# Altium footprint library MyPcbLib.PcbLib: 233 footprints (part 5 of 15)
Each footprint in its own frame and in the unit in brackets; x right, y up, seen from the top. Pads: shape width x height; smd on the part's side, far side on the other; paste and mask are expansions set on the pad; w line width, h text height; cw(c..) or ccw(c..) is an arc to the next point about the centre after c.
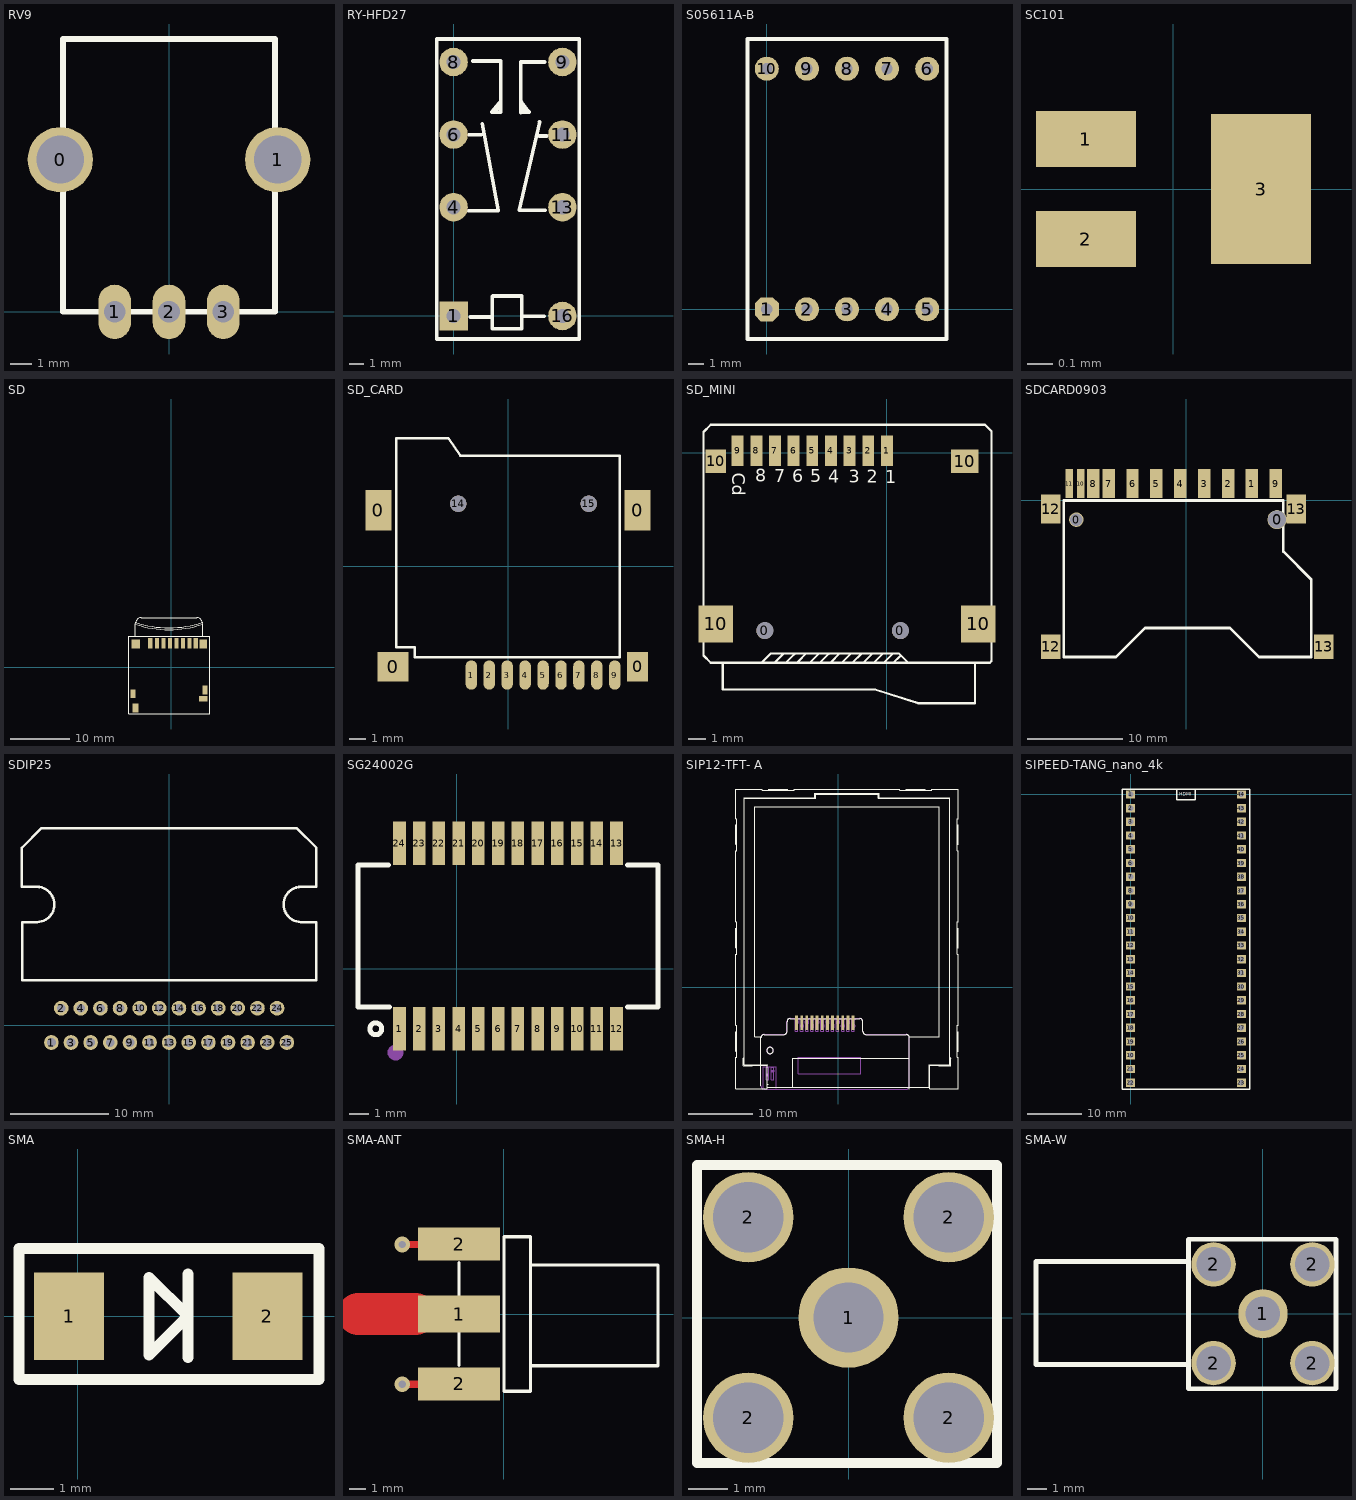
[diagram p4: the footprints below, top view; thin cyan lines are the x and y axes]

## RV9 [mm]
pads (5):
  round 3 hole 2.2: 0(-5,7) 1(5,7)
  oval 1.5x2.5 hole 1: 1(-2.5,0) 2(0,0) 3(2.5,0)
Top Overlay:
  lines w0.254: -4.876,0 -4.876,12.55 4.876,12.55 4.876,0 -4.876,0
3D body "User Library-RV09ACF-40_RK09K1130A5R.step": height 20, standoff -3.8, extent -4.876,0 4.876,12.55

## RY-HFD27 [mm]
pads (8):
  rect 2x2 hole 1: 1(0,0)
  round 2 hole 1: 4(0,7.62) 6(0,12.7) 8(0,17.78) 9(7.62,17.78) 11(7.62,12.7) 13(7.62,7.62) 16(7.62,0)
Top Overlay:
  lines w0.254: 1.022,7.375 3.128,7.375 2.004,13.46 ; 1.058,12.693 1.932,12.693 ; 1.183,-0.066 2.629,-0.066 ; 1.344,17.85 3.307,17.85 3.306,14.263 2.664,14.263 3.217,14.923 3.021,14.406 ; 4.734,15.013 5.287,14.281 5.269,14.263 4.698,14.245 4.699,17.779 6.394,17.779 ; 4.805,14.781 4.966,14.352 ; 4.877,-0.013 6.34,-0.013 ; 6.001,12.604 6.519,12.604 ; 6.019,13.585 4.609,7.411 6.429,7.411 ; -1.19,-1.61 8.81,-1.61 8.81,19.39 -1.19,19.39 -1.19,-1.61 ; 2.7,-0.887 2.7,1.076 2.7,1.361 2.736,1.397 4.77,1.397 4.77,-0.869 4.752,-0.887 2.7,-0.887
3D body "User Library-OMRON G5V-2.STEP": height 10.92, standoff -4, extent -1.143,-1.27 8.857,19.13

## S05611A-B [mil]
pads (10):
  oct 60x60 hole 28: 1(0,0)
  round 60 hole 28: 2(100,0) 3(200,0) 4(300,0) 5(400,0) 6(400,600) 7(300,600) 8(200,600) 9(100,600) 10(0,600)
Top Overlay:
  lines w10: -48.03,-74.02 448.03,-74.02 448.03,674.02 -48.03,674.02 -48.03,-74.02
  text ".56'" at 100,280 h60
3D body "S5611A-B.STEP": height 316.25, standoff -156.19, extent -50,-75 450,675

## SC101 [mm]
height 0.5
pads (3):
  rect 0.4x0.225 smd: 1(-0.35,0.2) 2(-0.35,-0.2)
  rect 0.4x0.6 smd: 3(0.35,0)
3D body "SC101.STEP": height 0.5, standoff 0, extent -0.519,-0.32 0.521,0.32

## SD [mm]
pads (14):
  rect 0.7x1.75 smd: P$1(-3.509,4.048) P$2(-2.409,4.048) P$3(-1.309,4.048) P$4(-0.209,4.048) P$5(0.891,4.048) P$6(1.991,4.048) P$7(3.091,4.048) P$8(4.151,4.048)
  rect 1.5x1.5 smd: P$9(-5.959,3.948)
  rect 1.3x1.5 smd: P$10(5.391,3.948)
  rect 0.8x1.5 smd: P$11(5.691,-3.802)
  rect 1.45x1 smd: P$12(5.391,-5.302)
  rect 0.8x1.4 smd: P$13(-6.409,-4.452)
  rect 1x1.55 smd: P$14(-6.009,-6.852)
Top Overlay:
  lines w0.127: -6.009,5.207 -6.009,7.248 -6.009,7.348 cw(c-5.009,7.348) -5.009,8.348 4.291,8.348 cw(c4.291,7.348) 5.291,7.348 5.291,7.248 ; -6.009,7.248 ccw(c-0.359,24.348) 5.291,7.248 ; -6.009,7.548 ccw(c-0.359,24.648) 5.291,7.548 ; 5.291,5.207 5.291,7.248 ; -7.112,-7.874 -7.112,5.207 6.477,5.207 6.477,-7.874 -7.112,-7.874
3D body "MicroSD.STEP": height 1.85, standoff -0.05, extent -7.515,-7.86 6.735,7.34

## SD_CARD [mm]
pads (15):
  rect 1.6x2.5 smd: 0(-7.953,3.429) 0(7.947,3.429)
  rect 1.9x1.8 smd: 0(-7.053,-6.171)
  rect 1.3x1.8 smd: 0(7.947,-6.171)
  oval 0.7x1.8 smd: 1(-2.253,-6.671) 2(-1.153,-6.671) 3(-0.053,-6.671) 4(1.047,-6.671) 5(2.147,-6.671) 6(3.247,-6.671) 7(4.347,-6.671) 8(5.447,-6.671) 9(6.547,-6.671)
  round 1 hole 1: 14(-3.053,3.829) 15(4.947,3.829)
Top Overlay:
  lines w0.152: -6.858,-4.953 -5.715,-4.953 -5.715,-5.588 -5.08,-5.588 6.401,-5.588 6.858,-5.588 6.858,6.782 -2.921,6.782 -3.658,7.849 -6.858,7.849 -6.858,-4.572 -6.858,-4.953
3D body "SDcard.STEP": height 2.05, standoff -0.4, extent -8,-7.4 8,7.85

## SD_MINI [mm]
pads (15):
  round 1 hole 1 unplated: 0(-7.2,-10.5) 0(0.8,-10.5)
  rect 0.7x1.8 smd: 1(0,0.127) 2(-1.1,0.127) 3(-2.2,0.127) 4(-3.3,0.127) 5(-4.4,0.127) 6(-5.5,0.127) 7(-6.6,0.127) 8(-7.7,0.127) 9(-8.8,0.127)
  rect 2.032x2.2 smd: 10(-10.1,-10.1) 10(5.4,-10.1)
  rect 1.2x1.4 smd: 10(-10.1,-0.5)
  rect 1.6x1.4 smd: 10(4.6,-0.5)
Top Overlay:
  lines w0.127: -9.677,-12.395 -9.677,-13.97 -0.686,-13.97 ; -6.629,-12.395 -6.096,-11.862 -6.096,-11.836 ; -5.969,-12.395 -5.461,-11.887 -5.461,-11.836 ; -5.232,-12.395 -5.232,-12.319 -4.75,-11.836 ; -4.547,-12.395 -3.988,-11.836 -3.962,-11.836 ; -3.962,-12.395 -3.429,-11.862 -3.429,-11.836 ; -3.327,-12.395 -2.769,-11.836 -2.667,-11.836 ; -2.667,-12.395 -2.108,-11.836 -2.083,-11.836 ; -2.032,-12.395 -1.499,-11.862 -1.499,-11.836 ; -1.397,-12.395 -0.838,-11.836 -0.711,-11.836 ; -0.762,-12.395 -0.203,-11.836 -0.178,-11.836 ; -0.711,-13.97 1.854,-14.783 5.207,-14.783 5.207,-12.421 ; -0.178,-12.395 0.381,-11.836 ; 0.381,-12.395 0.787,-11.989 0.864,-11.989 ; -10.389,-12.395 -7.391,-12.395 -6.833,-11.836 0.711,-11.836 1.27,-12.395 6.071,-12.395 ; -10.389,-12.395 6.071,-12.395 ; -10.389,-12.395 -10.82,-11.963 -10.82,1.219 -10.389,1.651 5.791,1.651 6.172,1.27 6.172,-12.294 6.071,-12.395
  text "1" at -0.102,-1.803 h0.76
  text "2" at -1.194,-1.778 h0.76
  text "3" at -2.261,-1.778 h0.76
  text "4" at -3.454,-1.778 h0.76
  text "5" at -4.521,-1.753 h0.76
  text "6" at -5.588,-1.753 h0.76
  text "7" at -6.655,-1.753 h0.76
  text "8" at -7.772,-1.727 h0.76
  text "Cd" at -9.119,-1.168 h0.76
3D body "sdcard.STEP": height 1.8, standoff -0.7, extent -10.372,-14.725 5.901,0.469

## SDCARD0903 [mm] "SD卡插座0903"
pads (17):
  round 1.524 hole 1.321: 0(-11.5,-2)
  round 2 hole 1.9: 0(9.5,-2)
  rect 1.3x3 smd: 1(6.875,1.778) 2(4.375,1.778) 3(1.875,1.778) 4(-0.625,1.778) 5(-3.125,1.778) 6(-5.625,1.778) 7(-8.125,1.778) 8(-9.75,1.778) 9(9.375,1.778)
  rect 0.762x3 smd: 10(-11.05,1.778) 11(-12.25,1.778)
  rect 2.032x2.54 smd: 12(-14.2,-15.3) 13(14.4,-15.3)
  rect 2.032x3.048 smd: 12(-14.2,-0.9) 13(11.5,-0.9)
Top Overlay:
  lines w0.279: -12.827,-16.383 -12.827,0 10.16,0 10.16,-5.334 13.081,-8.255 13.081,-16.383 7.62,-16.383 4.572,-13.335 0,-13.335 -4.318,-13.335 -7.366,-16.383 -12.827,-16.383
3D body "SD Kart.step": height 3, standoff -1, extent -14.224,-28.564 14.376,1.436

## SDIP25 [mm]
pads (25):
  round 1.5 hole 0.9: 1(-12,-1.75) 2(-11,1.75) 3(-10,-1.75) 4(-9,1.75) 5(-8,-1.75) 6(-7,1.75) 7(-6,-1.75) 8(-5,1.75) 9(-4,-1.75) 10(-3,1.75) 11(-2,-1.75) 12(-1,1.75) 13(0,-1.75) 14(1,1.75) 15(2,-1.75) 16(3,1.75) 17(4,-1.75) 18(5,1.75) 19(6,-1.75) 20(7,1.75) 21(8,-1.75) 22(9,1.75) 23(10,-1.75) 24(11,1.75) 25(12,-1.75)
Top Overlay:
  lines w0.254: -14.986,10.505 -14.986,4.6 15,4.6 15,10.53 ; -14.986,10.53 -13.437,10.53 ; -13.538,14.137 -15,14.137 -15,18.1 -13,20.1 13,20.1 15,18.1 15,14.137 ; 13.386,14.137 14.975,14.137 ; 13.437,10.53 14.975,10.53
  lines w0.257: -13.459,14.12 cw(c-13.5,12.321) -13.451,10.521 ; 13.426,14.12 ccw(c13.475,12.321) 13.433,10.521
3D body "HZIP25.step": height 19.2, standoff -2.5, extent -14.063,-1.882 15.138,6.528

## SG24002G [mm]
pads (24):
  rect 0.64x2.2 smd: 1(-2.899,-3.043) 2(-1.899,-3.043) 3(-0.899,-3.043) 4(0.101,-3.043) 5(1.101,-3.043) 6(2.101,-3.043) 7(3.101,-3.043) 8(4.101,-3.043) 9(5.101,-3.043) 10(6.101,-3.043) 11(7.101,-3.043) 12(8.101,-3.043) 13(8.101,6.357) 14(7.101,6.357) 15(6.101,6.357) 16(5.101,6.357) 17(4.101,6.357) 18(3.101,6.357) 19(2.101,6.357) 20(1.101,6.357) 21(0.101,6.357) 22(-0.899,6.357) 23(-1.899,6.357) 24(-2.899,6.357)
Top Overlay:
  circle w0.254: c-4.099,-3.043 r0.3
  lines w0.254: -3.45,5.257 -4.999,5.257 -4.999,-1.943 -3.399,-1.943 ; 8.652,-1.943 10.201,-1.943 10.201,5.257 8.652,5.257
Mechanical 15:
  circle w0.4: c-3.099,-4.243 r0.2

## SIP12-TFT- A [mm]
pads (12):
  rect 0.43x2.3 smd: 1(2.305,-5.523) 2(1.505,-5.523) 3(0.705,-5.523) 4(-0.095,-5.523) 5(-0.895,-5.523) 6(-1.695,-5.523) 7(-2.495,-5.523) 8(-3.295,-5.523) 9(-4.095,-5.523) 10(-4.895,-5.523) 11(-5.695,-5.523) 12(-6.495,-5.523)
Top Overlay:
  circle w0.127: c-10.635,-9.83 r0.5
  lines w0.127: -15.793,-9.916 -15.993,-9.916 ; -15.793,-6.916 -15.993,-6.916 ; -15.793,6.184 -15.993,6.184 ; -15.793,9.184 -15.993,9.184 ; -15.793,22.284 -15.993,22.284 ; -15.793,25.284 -15.993,25.284 ; -14.243,-12.202 -14.243,-12.052 ; -12.036,-15.354 -12.036,-7.854 cw(c-11.536,-7.854) -11.536,-7.354 -8.476,-7.354 ccw(c-8.476,-6.854) -7.976,-6.854 -7.976,-5.354 cw(c-7.476,-5.354) -7.476,-4.854 3.324,-4.854 cw(c3.324,-5.354) 3.824,-5.354 3.824,-6.854 ccw(c4.324,-6.854) 4.324,-7.354 10.574,-7.354 cw(c10.574,-7.854) 11.074,-7.854 11.074,-15.516 ; -12.036,-7.696 -13.009,-7.696 -13.009,28.144 15.723,28.144 15.723,-7.696 11.074,-7.696 ; -11.043,-15.566 14.257,-15.566 ; -10.943,-15.516 14.157,-15.516 14.157,-12.052 17.323,-12.052 17.323,29.468 6.257,29.468 6.257,30.084 -3.543,30.084 -3.543,29.468 -14.609,29.468 -14.609,-12.052 -10.943,-12.052 ; -10.943,-15.066 -11.043,-15.066 -10.893,-15.066 ; -10.84,30.684 -10.84,30.884 ; -8.643,-15.566 -8.643,-15.516 ; -7.84,30.684 -7.84,30.884 ; -7.083,-15.494 -7.083,-11.002 11.057,-11.002 11.057,-15.824 ; 10.555,30.684 10.555,30.884 ; 11.857,-15.566 11.857,-15.516 ; 13.555,30.684 13.555,30.884 ; 14.107,-15.066 14.257,-15.066 14.157,-15.066 ; 17.157,-12.202 17.157,-12.052 ; 17.373,-4.466 17.373,22.214 ; 18.507,-9.916 18.707,-9.916 ; 18.507,-6.916 18.707,-6.916 ; 18.507,6.184 18.707,6.184 ; 18.507,9.184 18.707,9.184 ; 18.507,22.284 18.707,22.284 ; 18.507,25.284 18.707,25.284 ; -15.993,-9.916 -15.993,-6.916 ; -15.993,-9.916 -15.993,-6.916 ; -15.993,6.184 -15.993,9.184 ; -15.993,6.184 -15.993,9.184 ; -15.993,22.284 -15.993,25.284 ; -15.993,22.284 -15.993,25.284 ; -10.84,30.884 -7.84,30.884 ; -10.84,30.884 -7.84,30.884 ; 10.555,30.884 13.555,30.884 ; 10.555,30.884 13.555,30.884 ; 18.707,-9.916 18.707,-6.916 ; 18.707,-9.916 18.707,-6.916 ; 18.707,6.184 18.707,9.184 ; 18.707,6.184 18.707,9.184 ; 18.707,22.284 18.707,25.284 ; 18.707,22.284 18.707,25.284 ; -15.993,-15.816 -11.043,-15.816 -11.043,-12.102 -13.259,-12.102 -13.366,-12.202 -14.759,-12.202 -14.759,-11.062 -14.659,-10.898 -14.659,29.518 -3.643,29.518 -3.643,30.184 6.357,30.184 6.357,29.518 17.373,29.518 17.373,-10.898 17.473,-11.062 17.473,-12.202 15.657,-12.202 15.527,-12.102 14.257,-12.102 14.257,-15.816 18.707,-15.816 18.707,-10.916 18.507,-10.916 18.507,-5.916 18.707,-5.916 18.707,5.184 18.507,5.184 18.507,10.184 18.707,10.184 18.707,21.284 18.507,21.284 18.507,26.284 18.707,26.284 18.707,30.884 14.555,30.884 14.555,30.684 9.555,30.684 9.555,30.884 -6.84,30.884 -6.84,30.684 -11.84,30.684 -11.84,30.884 -15.993,30.884 -15.993,26.284 -15.793,26.284 -15.793,21.284 -15.993,21.284 -15.993,10.184 -15.793,10.184 -15.793,5.184 -15.993,5.184 -15.993,-5.916 -15.793,-5.916 -15.793,-10.916 -15.993,-10.916 -15.993,-15.816
Mechanical 3:
  drawing of 186 lines, arcs and shapes, not listed
  text "K" at -11.202,-14.855 h0.41
  text "A" at -10.395,-14.839 h0.41
3D body "LCD.STEP": height 2.2, standoff 0, extent -15.9,-15.68 18.6,30.92

## SIPEED-TANG_nano_4k [mil]
pads (44):
  rect 65x60 hole 40: 1(0,0) 2(0,-100) 3(0,-200) 4(0,-300) 5(0,-400) 6(0,-500) 7(0,-600) 8(0,-700) 9(0,-800) 10(0,-1900) 10(0,-900) 11(0,-1000) 12(0,-1100) 13(0,-1200) 14(0,-1300) 15(0,-1400) 16(0,-1500) 17(0,-1600) 18(0,-1700) 19(0,-1800) 21(0,-2000) 22(0,-2100) 23(807.09,-2100) 24(807.09,-2000) 25(807.09,-1900) 26(807.09,-1800) 27(807.09,-1700) 28(807.09,-1600) 29(807.09,-1500) 30(807.09,-1400) 31(807.09,-1300) 32(807.09,-1200) 33(807.09,-1100) 34(807.09,-1000) 35(807.09,-900) 36(807.09,-800) 37(807.09,-700) 38(807.09,-600) 39(807.09,-500) 40(807.09,-400) 41(807.09,-300) 42(807.09,-200) 43(807.09,-100) 44(807.09,0)
Top Overlay:
  lines w10: 334.65,39.37 334.65,-39.37 472.44,-39.37 472.44,39.37 ; -59.06,-2145.67 -59.06,39.37 866.14,39.37 866.14,-2145.67 0,-2145.67 -39.37,-2145.67 -59.06,-2145.67
  text "HDMI" at 354.33,-19.68 h39.37

## SMA [mil] "DO-214AC(2010)"
pads (2):
  rect 63x78.74 smd: 1(-8,0) 2(170.56,0)
Top Overlay:
  lines w10: 99,-37 99,38 ; -53,-57 -53,61 217,61 217,-57 -53,-57 ; 64,-35 64,35 99,0 64,-35
3D body "DO-214AC.STEP": height 94.49, standoff 0, extent -7.55,-52.15 173.55,54.15

## SMA-ANT [mil] "142-0701-801/806"
pads (3):
  rect 200x90 smd: 1(-109,0)
  rect 200x80 all layers, no hole: 2(-109,-170) 2(-109,170)
via -247,-171 diameter 38 hole 18
via -247,169 diameter 38 hole 18
Top Layer:
  lines w18: -248,169 -128,169 ; -247,-171 -99,-171
  lines w103: -355,0 -216,0
Top Overlay:
  lines w7.87: -109,-125 -109,125 ; 68,-126 375,-126 375,119 68,119 ; 0,-188 0,188 65,188 65,-188 0,-188
3D body "SMA - 50 Ohm Connectors 142-0701-801.step": height 175.51, standoff -136.3, extent -190.91,-186 370.9,188.8

## SMA-H [mil]
pads (5):
  round 100 hole 70: 1(0,0)
  round 90 hole 70: 2(-100,-100) 2(-100,100) 2(100,-100) 2(100,100)
Top Overlay:
  lines w10: -151,-145 -151,152 148,152 148,-145 -151,-145
3D body "SMA-H.stp": height 105.71, standoff -430.31, extent -124.21,-124.2 124.21,124.22

## SMA-W [mil]
pads (5):
  round 100 hole 70: 1(0,0)
  round 90 hole 70: 2(-100,-100) 2(-100,100) 2(100,-100) 2(100,100)
Top Overlay:
  lines w10: -152,-103 -460,-103 -460,106 -151,106 ; -151,-152 -151,151 148,151 148,-152 -151,-152
3D body "Samtec-SMA-J-P-H-RA-TH1.step": height 108.06, standoff -447.24, extent -459.69,-139.8 134.8,135.79